# Altium footprint library Pcblib.PcbLib: 281 footprints (part 14 of 18)
Each footprint in its own frame and in the unit in brackets; x right, y up, seen from the top. Pads: shape width x height; smd on the part's side, far side on the other; paste and mask are expansions set on the pad; w line width, h text height; cw(c..) or ccw(c..) is an arc to the next point about the centre after c.
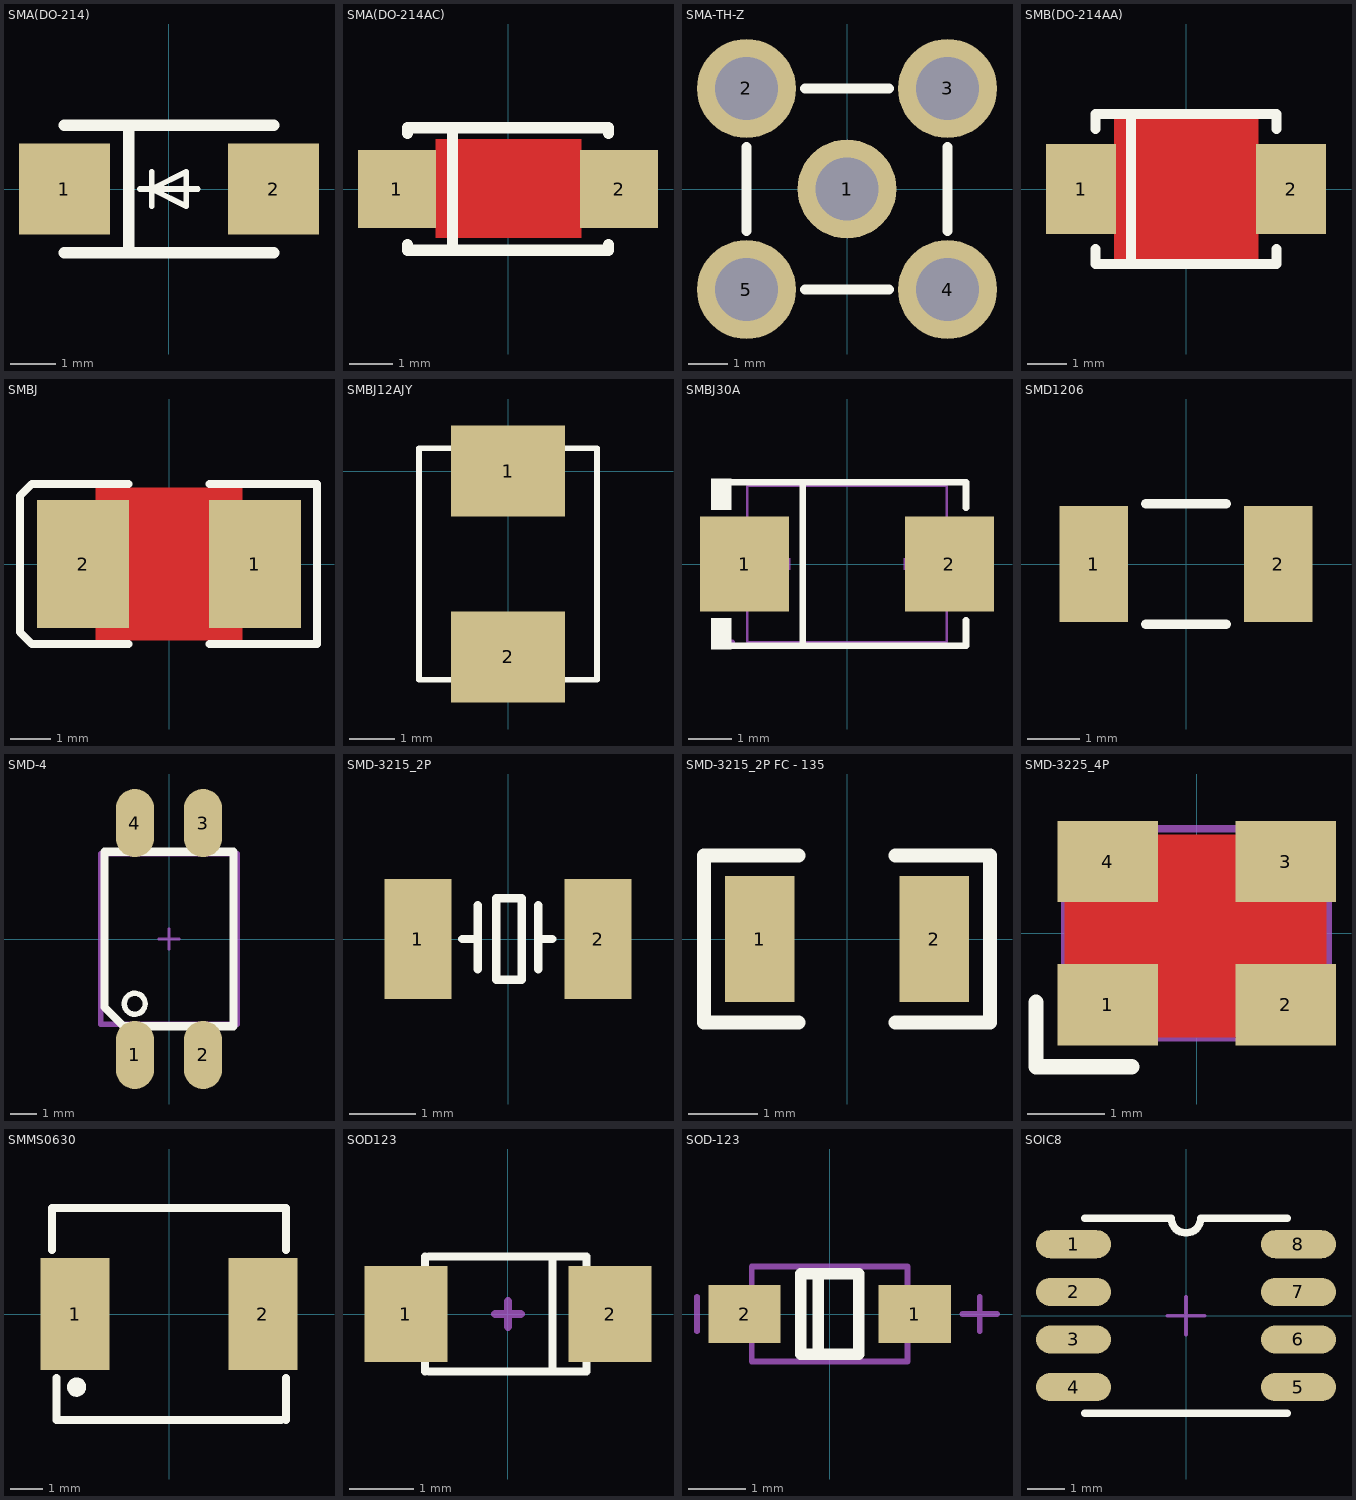
[diagram p13: the footprints below, top view; thin cyan lines are the x and y axes]

## SMA(DO-214) [mm]
pads (2):
  rect 2x2 smd: 1(-2.3,0) 2(2.3,0)
Top Overlay:
  lines w0.127: -0.635,0 0.635,0 ; -0.381,-0.381 -0.381,0 ; -0.381,0.381 -0.381,0 ; -0.381,0 0.381,-0.381 0.381,0 0.381,0.381 -0.381,0
  lines w0.254: -2.3,-1.4 2.3,-1.4 ; -2.3,1.4 2.3,1.4 ; -0.889,-1.4 -0.889,1.4
Mechanical 15:
  region: -2.98,-0.157 -2.983,-0.14 -2.983,0.076 -1.619,0.074 -1.61,0.053 -1.61,-0.164
  region: 2.281,0.447 2.281,-0.425 2.283,-0.427 2.39,-0.427 2.395,-0.422 2.395,0.447 2.39,0.452 2.273,0.452
  region: 2.995,0.028 1.617,0.028 1.617,0.136 1.72,0.142 2.987,0.14 2.991,0.144 2.991,0.032 2.993,0.03

## SMA(DO-214AC) [mil]
pads (2):
  rect 70x70 smd: 1(-100,0) 2(100,0)
Top Layer:
  pour cut-out: -65,45 66,45 66,-44 -65,-44
Top Overlay:
  lines w10: -90.55,-50 -90.55,-55.12 90.55,-55.12 90.55,-50 ; -90.55,50 -90.55,55.12 90.55,55.12 90.55,50 ; -50,-55.12 -50,55.12
3D body: height 104.09, standoff 0.07, extent -105.51,-57.01 105.51,57.01

## SMA-TH-Z [mm]
pads (5):
  round 2.5 hole 1.6: 1(0,0) 2(-2.54,2.54) 3(2.54,2.54) 4(2.54,-2.54) 5(-2.54,-2.54)
Top Overlay:
  lines w0.254: -2.54,-1.059 -2.54,1.059 ; -1.059,-2.54 1.059,-2.54 ; -1.059,2.54 1.059,2.54 ; 2.54,-1.059 2.54,1.059

## SMB(DO-214AA) [mil]
pads (2):
  rect 70x90 smd: 1(-105,0) 2(105,0)
Top Layer:
  pour cut-out: -72,75 72,75 72,-75 -72,-75
Top Overlay:
  lines w10: -90.55,-60 -90.55,-74.8 90.55,-74.8 90.55,-60 ; -90.55,60 -90.55,74.8 90.55,74.8 90.55,60 ; -55,-74.8 -55,74.8
3D body: height 104.09, standoff 0.07, extent -110,-77.99 110,77.99

## SMBJ [mm]
height 2.62
pads (2):
  rect 2.3x3.2 smd: 1(2.15,0) 2(-2.15,0)
Top Layer:
  pour cut-out: -1.829,1.905 1.829,1.905 1.829,-1.905 -1.829,-1.905
Top Overlay:
  lines w0.2: -1.016,-2 -3.429,-2 -3.725,-1.704 -3.725,1.704 -3.429,2 -1.016,2 ; 1.016,-2 3.7,-2 3.7,2 1.016,2
Mechanical 15:
  lines w0.1: -0.2,0 0.2,0 ; 0,-0.2 0,0.2
3D body: height 0.4, standoff 0, extent -2.542,-1.524 2.54,1.524

## SMBJ12AJY [mm] "DO-214-AA/SMB; 2 C-Bend Leads; Body 5.3 x 3.6 mm, inc. leads (LxW)"
height 2.65
pads (2):
  rect 2.5x2 smd: 1(0,0) 2(0,-4.07)
Top Overlay:
  lines w0.127: -1.95,-4.57 -1.95,0.5 1.95,0.5 1.95,-4.57 -1.95,-4.57

## SMBJ30A [mm]
pads (2):
  rect 2.047x2.192 smd mask+0.051: 1(-2.361,0) 2(2.361,0)
Top Overlay:
  region: -2.668,-1.962 -2.668,-1.249 -3.125,-1.249 -3.125,-1.962
  region: -2.668,1.962 -2.668,1.249 -3.125,1.249 -3.125,1.962
  lines w0.152: -2.744,-1.886 2.744,-1.886 2.744,-1.299 ; -2.744,1.886 2.744,1.886 2.744,1.299 ; -1.016,-1.886 -1.016,1.886
Mechanical 6:
  region: 1.989,-0.905 1.989,0.905 1.717,0.905 1.717,-0.905
  region: 2.396,-0.136 2.396,0.136 1.31,0.136 1.31,-0.136
  region: -2.396,-0.136 -2.396,0.136 -1.31,0.136 -1.31,-0.136
Mechanical 15:
  region: 2.649,-1.015 2.649,1.015 1.509,1.015 1.509,-1.015
  region: -2.649,-1.015 -2.649,1.015 -1.509,1.015 -1.509,-1.015
  region: -2.59,-1.8 -2.59,-1.775 -2.625,-1.74 -2.674,-1.74 -2.709,-1.775 -2.709,-1.8 -2.709,-1.825 -2.674,-1.86 -2.625,-1.86 -2.59,-1.825
  lines w0.051: -2.3,-1.8 2.3,-1.8 2.3,1.8 -2.3,1.8 -2.3,-1.8

## SMD1206 [mm]
height 0.5
pads (2):
  rect 1.3x2.2 smd: 1(-1.75,0) 2(1.75,0)
Top Overlay:
  lines w0.178: -0.762,-1.143 0.762,-1.143 ; -0.762,1.143 0.762,1.143
3D body: height 0.4, standoff 0, extent -1.778,-1.016 1.651,1.016

## SMD-4 [mil]
pads (4):
  oval 56x100 smd: 1(-50,-170) 2(50,-170) 3(50,170) 4(-50,170)
Top Overlay:
  circle w7.87: c-50.31,-95 r15.31
  lines w11.81: -94.49,-100 -94.49,127.95 94.49,127.95 94.49,-127.95 -66.54,-127.95 -94.49,-100
Mechanical 13:
  lines w7.87: -100,-125 -100,125 100,125 100,-125 -100,-125
Mechanical 15:
  lines w3.94: -15,0 15,0 ; 0,-15 0,15
3D body: height 20.79, standoff 0.79, extent -100,-125 100,125

## SMD-3215_2P [mm]
pads (2):
  rect 1x1.8 smd: 1(-1.35,0) 2(1.35,0)
Top Overlay:
  lines w0.127: -0.686,0 -0.457,0 ; -0.457,-0.457 -0.457,0.508 ; 0.457,-0.457 0.457,0.508 ; 0.457,0 0.66,0 ; -0.178,-0.61 -0.178,0.61 0.203,0.61 0.203,-0.61 -0.178,-0.61
3D body: height 0.8, standoff 0, extent -1.651,-0.889 1.651,0.889

## SMD-3215_2P FC - 135 [mm]
pads (2):
  rect 1x1.8 smd: 1(-1.25,0) 2(1.25,0)
Top Overlay:
  lines w0.2: -0.695,-1.2 -2.05,-1.2 -2.05,1.2 -0.695,1.2 ; 0.695,-1.2 2.05,-1.2 2.05,1.2 0.695,1.2

## SMD-3225_4P [mm] "OSC_2.5x2mm"
height 0.6
pads (4):
  rect 1.3x1.05 smd: 1(-1.15,-0.925) 2(1.15,-0.925) 3(1.15,0.925) 4(-1.15,0.925)
Top Layer:
  pour cut-out: 1.676,-1.346 -1.702,-1.346 -1.702,1.27 1.676,1.27
Top Overlay:
  lines w0.2: -2.075,-0.889 -2.075,-1.725 -0.836,-1.725
Mechanical 5:
  circle w0.1: c-1.216,-0.889 r0.2
  lines w0.1: -1.7,-1.35 -1.7,1.35 1.7,1.35 1.7,-1.35 -1.7,-1.35
3D body: height 0.8, standoff 0.5, extent -1.337,-0.964 -1.063,-0.69
3D body: height 0.6, standoff 0, extent -1.778,-1.397 1.778,1.397

## SMMS0630 [mm] "贴片电感"
pads (2):
  rect 2.15x3.5 smd: 1(-2.925,0) 2(2.925,0)
Top Overlay:
  circle w0.3: c-2.88,-2.28 r0.15
  lines w0.254: -3.65,2 -3.65,3.3 3.65,3.3 3.65,2 ; -3.505,-3.3 -3.505,-2 ; -3.5,-3.3 3.5,-3.3 ; 3.65,-3.3 3.65,-2

## SOD123 [mm]
height 0.65
pads (2):
  rect 1.3x1.5 smd: 1(-1.6,0) 2(1.6,0)
Top Overlay:
  lines w0.127: -1.3,-0.9 -1.3,-0.5 -1.3,-0.373 ; -1.3,0.373 -1.3,0.5 -1.3,0.9 ; -1.238,-0.9 1.23,-0.9 1.23,-0.396 ; -1.238,0.9 1.23,0.9 1.23,0.396 ; 0.7,-0.9 0.7,0.9
Mechanical 15:
  lines w0.127: -0.2,0 0.2,0 ; 0,-0.2 0,0.2

## SOD-123 [mm]
pads (2):
  rect 1.25x1 smd: 1(1.475,0) 2(-1.475,0)
Top Overlay:
  lines w0.2: -0.2,-0.7 -0.2,0.7 ; -0.5,-0.7 0.5,-0.7 0.5,0.7 -0.5,0.7 -0.5,-0.7
Mechanical 13:
  lines w0.1: -1.35,-0.825 -1.35,0.825 1.35,0.825 1.35,-0.825 -1.35,-0.825
Mechanical 15:
  lines w0.1: -2.3,-0.3 -2.3,0.3 ; 2.3,0 2.9,0 ; 2.6,-0.3 2.6,0.3
3D body "SOD123.STEP": height 1.35, standoff 0, extent -1.85,-0.775 1.85,0.775

## SOIC8 [mm]
height 1.75
pads (8):
  oval 2x0.75 smd: 1(-3,1.905) 2(-3,0.635) 3(-3,-0.635) 4(-3,-1.905) 5(3,-1.905) 6(3,-0.635) 7(3,0.635) 8(3,1.905)
Top Overlay:
  lines w0.2: -2.7,-2.6 2.7,-2.6 ; -2.7,2.6 -0.394,2.6 ccw(c0,2.6) 0.394,2.6 2.7,2.6
Mechanical 15:
  lines w0.1: -0.5,0 0.5,0 ; 0,-0.5 0,0.5
3D body: height 1.2, standoff 0, extent -2.286,-2.54 2.286,2.54